# Altium footprint library 电阻封装库.PcbLib: 218 footprints (part 13 of 14)
Each footprint in its own frame and in the unit in brackets; x right, y up, seen from the top. Pads: shape width x height; smd on the part's side, far side on the other; paste and mask are expansions set on the pad; w line width, h text height; cw(c..) or ccw(c..) is an arc to the next point about the centre after c.
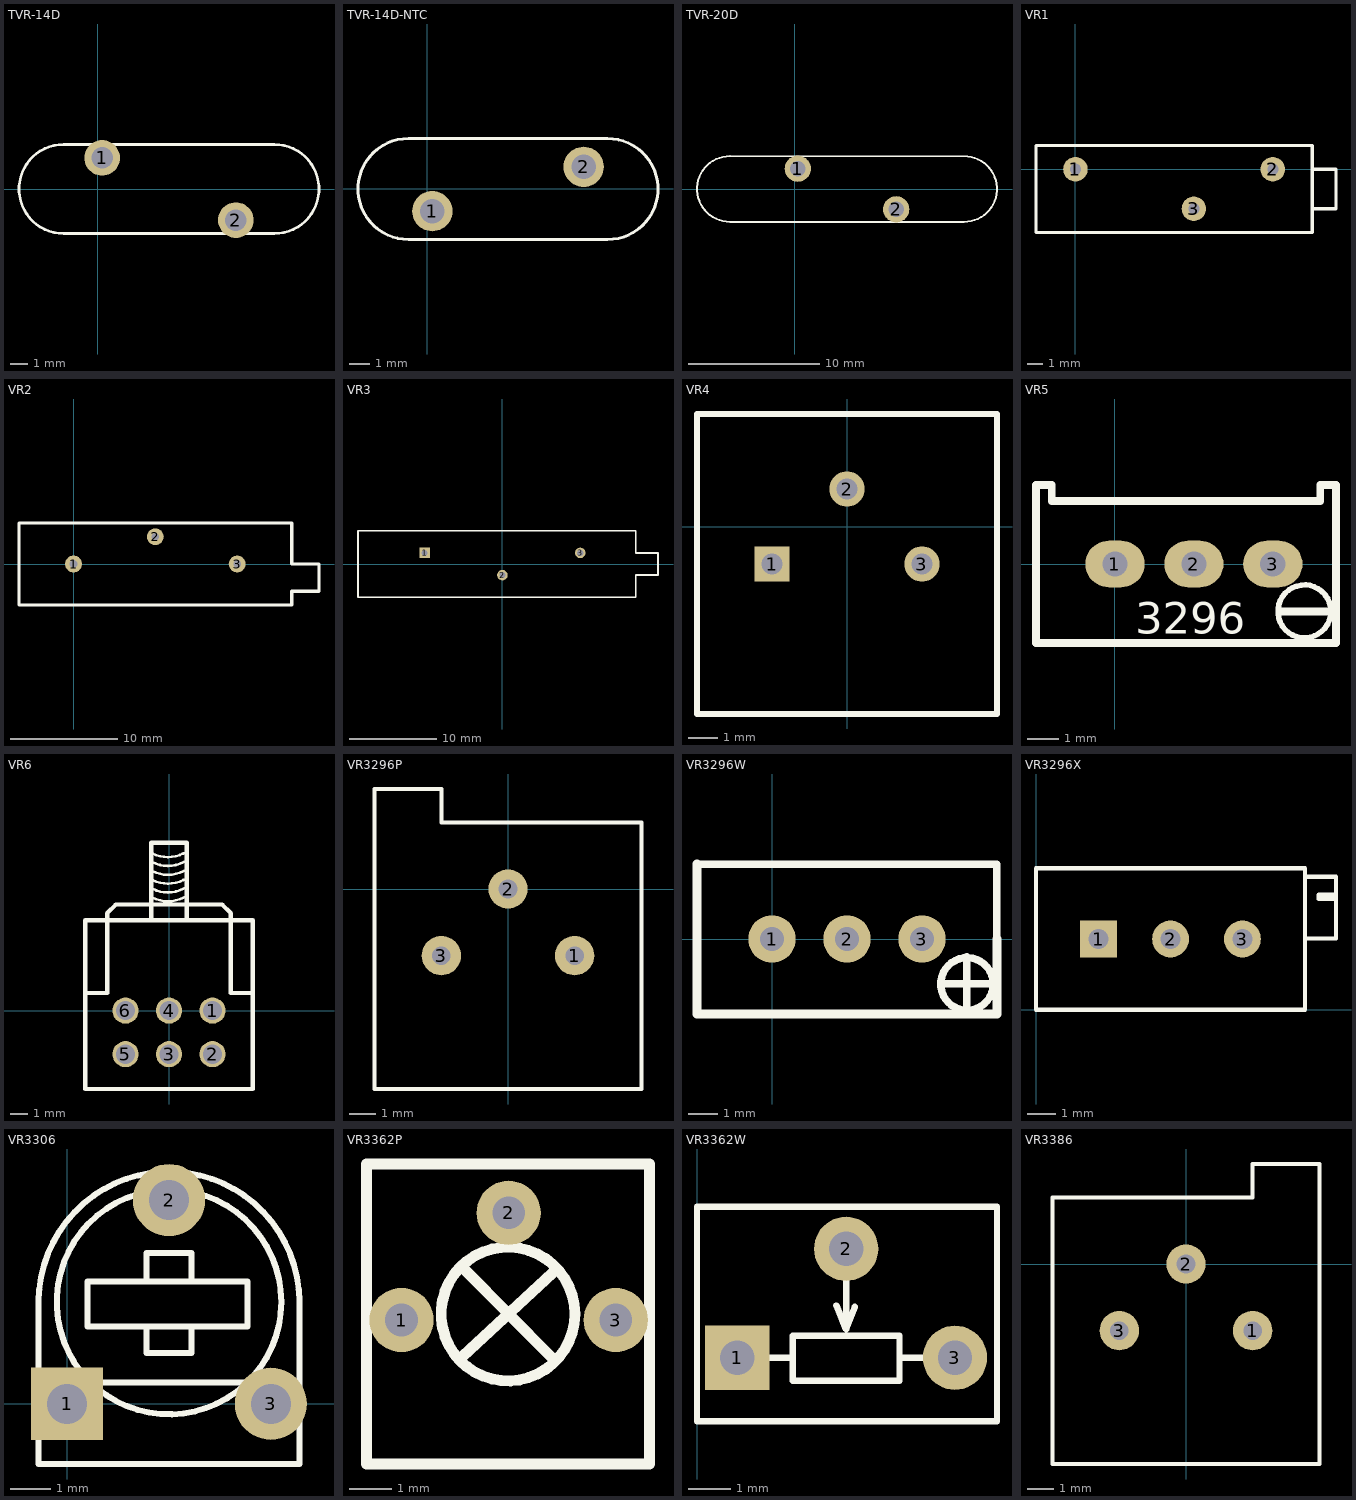
[diagram p12: the footprints below, top view; thin cyan lines are the x and y axes]

## TVR-14D [mm]
pads (2):
  round 2 hole 1.2: 1(0.25,1.75) 2(7.75,-1.75)
Top Overlay:
  lines w0.15: -1.921,-2.5 cw(c-1.921,0) -1.921,2.5 9.921,2.5 cw(c9.921,0) 9.921,-2.5 -1.921,-2.5
3D body "User Library-MOV 14mm.step": height 20.5, standoff -2, extent -4.496,-3.15 12.496,3.15

## TVR-14D-NTC [mm]
pads (2):
  round 2 hole 1.2: 1(0.25,-1.1) 2(7.75,1.1)
Top Overlay:
  lines w0.15: -0.929,-2.5 8.929,-2.5 ; -0.929,-2.498 cw(c-0.929,0.002) -0.929,2.502 ; -0.929,2.5 8.929,2.5 ; 8.929,-2.502 ccw(c8.929,-0.002) 8.929,2.498
3D body "User Library-SG200.step": height 15.5, standoff -8.5, extent -3.5,-2.505 11.5,2.505

## TVR-20D [mm]
pads (2):
  round 2 hole 1.2: 1(0.25,1.55) 2(7.75,-1.55)
Top Overlay:
  lines w0.15: -4.935,-2.5 12.935,-2.5 ; -4.935,-2.497 cw(c-4.935,0.003) -4.935,2.503 ; -4.935,2.501 12.935,2.497 cw(c12.935,-0.003) 12.935,-2.503
3D body "User Library-MOV 20mm.step": height 27.01, standoff -2, extent -7.506,-2.603 15.506,2.604

## VR1 [mil]
pads (3):
  round 62 hole 28: 1(0,0) 2(500,0) 3(300,-100)
Top Overlay:
  lines w8: 600,-100 660,-100 660,0 600,0 ; 600,-100 600,-160 -100,-160 -100,60 600,60 600,0 ; 600,-100 600,0

## VR2 [mil]
pads (3):
  round 62 hole 28: 1(0,0) 2(300,100) 3(600,0)
Top Overlay:
  lines w12: -200,-150 -200,150 800,150 800,0 900,0 900,-100 800,-100 800,-150 -200,-150

## VR3 [mm] "Tapped Resistor; 3 Leads"
pads (3):
  rect 1.2x1.2 hole 0.7: 1(-8.89,1.27)
  round 1.2 hole 0.7: 2(0,-1.27) 3(8.89,1.27)
Top Overlay:
  lines w0.2: -16.51,-3.81 -16.51,3.81 15.24,3.81 15.24,1.27 17.78,1.27 17.78,-1.27 15.24,-1.27 15.24,-3.81 -16.51,-3.81
3D body "vr3.STEP": height 10, standoff 0, extent -16.576,-3.556 16.424,3.544

## VR4 [mm] "Feed-Through Capacitor; 3 Leads"
pads (3):
  rect 1.2x1.2 hole 0.7: 1(-2.54,-1.27)
  round 1.2 hole 0.7: 2(0,1.27) 3(2.54,-1.27)
Top Overlay:
  lines w0.2: -5.08,-6.35 5.08,-6.35 5.08,3.81 2.54,3.81 -5.08,3.81 -5.08,-6.35
3D body "vr4.STEP": height 6, standoff 0, extent -5.022,-6.321 4.978,3.679

## VR5 [mm]
pads (3):
  oval 1.905x1.5 hole 0.813: 1(0,0) 2(2.54,0) 3(5.08,0)
Top Overlay:
  circle w0.178: c6.096,-1.524 r0.852
  lines w0.254: 5.334,-1.524 6.948,-1.524 ; -2.54,-2.54 7.112,-2.54 7.112,2.54 6.604,2.54 6.604,2.032 -2.032,2.032 -2.032,2.54 -2.54,2.54 -2.54,-2.54
  text "3296" at 0.65,-2.25 h1.02
3D body "User Library-67W.STEP": height 12.18, standoff -4.09, extent -2.309,-2.461 7.491,2.489

## VR6 [mm]
pads (6):
  round 1.5 hole 1.1: 1(2.5,0) 2(2.5,-2.5) 3(0,-2.5) 4(0,0) 5(-2.5,-2.5) 6(-2.5,0)
Top Overlay:
  lines w0.15: -0.938,6.486 ccw(c-0.063,8.236) 1.016,6.604 ; -0.938,6.994 ccw(c-0.063,8.744) 1.016,7.112 ; -0.938,7.502 ccw(c-0.063,9.252) 1.016,7.62 ; -0.938,8.01 ccw(c-0.063,9.76) 1.016,8.128 ; -0.938,8.518 ccw(c-0.063,10.268) 1.016,8.636 ; -0.938,9.026 ccw(c-0.063,10.776) 1.016,9.144
  lines w0.254: -4.8,1.016 -3.556,1.016 -3.556,5.2 -3.556,5.588 -3.048,6.096 3.048,6.096 3.556,5.588 3.556,5.2 3.556,1.016 4.8,1.016 ; -1.016,5.2 -1.016,9.652 1.016,9.652 1.016,5.2 ; -4.8,-4.5 -4.8,5.2 4.8,5.2 4.8,-4.5 -4.8,-4.5

## VR3296P [mm]
pads (3):
  round 1.5 hole 0.711: 1(2.54,-2.54) 2(0,0) 3(-2.54,-2.54)
Top Overlay:
  lines w0.15: -5.08,-7.62 5.08,-7.62 5.08,2.54 -2.54,2.54 -2.54,3.81 -5.08,3.81 -5.08,-7.62
3D body "3296P.step": height 4.4, standoff -8.69, extent -4.765,-7.776 4.765,3.774

## VR3296W [mm]
pads (3):
  round 1.6 hole 0.8: 1(0,0) 2(2.54,0) 3(5.08,0)
Top Overlay:
  circle w0.254: c6.604,-1.524 r0.89
  lines w0.254: -2.54,2.54 7.62,2.54 7.62,0 ; 5.8,-1.524 7.494,-1.524 ; 6.604,-2.54 6.604,-0.6
  lines w0.305: -2.54,2.54 -2.54,-2.54 7.62,-2.54 7.62,0

## VR3296X [mm]
pads (3):
  rect 1.3x1.3 hole 0.711: 1(2.21,2.5)
  round 1.3 hole 0.711: 2(4.75,2.5) 3(7.29,2.5)
Top Overlay:
  lines w0.15: 9.5,2.515 10.592,2.515 10.592,4.699 9.5,4.699 ; 10.592,3.2 10.592,3.912 9.982,3.912 9.982,4.064 10.592,4.064 ; 0,0 9.5,0 9.5,5 0,5 0,0
3D body "3296X.step": height 10.03, standoff -6.4, extent -0.013,0.084 11.037,4.915

## VR3306 [mm]
pads (3):
  rect 1.8x1.8 hole 1: 1(0,0)
  round 1.8 hole 1: 2(2.54,5.08) 3(5.08,0)
Top Overlay:
  circle w0.15: c2.54,2.54 r2.801
  lines w0.15: -0.711,-1.5 5.789,-1.5 5.789,2.539 ; -0.71,-1.499 -0.71,2.54 cw(c2.54,2.54) 5.79,2.54 ; 0.61,0.533 4.572,0.533 ; 1.981,1.93 1.981,1.27 3.099,1.27 3.099,1.93 ; 1.981,3.099 1.981,3.759 3.099,3.759 3.099,3.099 ; 0.508,1.93 0.508,3.048 4.496,3.048 4.496,1.93 0.508,1.93
3D body "User Library-Trimpot Vertical.step": height 4.2, standoff -1.45, extent 9.327,-1.755 19.327,13.545
3D body "User Library-Trimpot Horizontal.step": height 4.2, standoff -5.6, extent 9.103,14.919 19.103,25.119
3D body "User Library-Trimmer, 3306F-1.STEP": height 7.62, standoff -3.04, extent -0.865,-2.294 5.945,5.957

## VR3362P [mm]
pads (3):
  round 1.5 hole 0.762: 1(47.198,57.912) 2(49.698,60.412) 3(52.198,57.912)
Top Overlay:
  circle w0.254: c49.683,58.052 r1.56
  lines w0.254: 48.63,57.066 50.721,59.013 ; 48.702,59.056 50.678,57.066 ; 46.383,54.552 52.983,54.552 52.983,61.552 46.383,61.552 46.383,54.552

## VR3362W [mm]
pads (3):
  rect 1.5x1.5 hole 0.8: 1(0.94,3.48)
  round 1.5 hole 0.8: 2(3.48,6.02) 3(6.02,3.48)
Top Overlay:
  lines w0.15: 0.94,3.48 2.235,3.48 ; 3.251,4.699 3.48,4.14 ; 3.48,5.842 3.48,4.14 ; 3.683,4.674 3.48,4.14 ; 4.724,3.48 6.02,3.48 ; 2.235,3.48 2.235,2.946 4.724,2.946 4.724,3.988 2.235,3.988 2.235,3.48 ; 0,2 0,7 7,7 7,2 0,2
3D body "User Library-3362W.step": height 6.99, standoff -1.5, extent 0.2,2.365 6.8,7.075

## VR3386 [mm]
pads (3):
  round 1.5 hole 0.711: 1(2.54,-2.54) 2(0,0) 3(-2.54,-2.54)
Top Overlay:
  lines w0.15: -5.08,-7.62 5.08,-7.62 5.08,3.81 2.54,3.81 2.54,2.54 -5.08,2.54 -5.08,-7.62
3D body "SW3dPS-3386P-S.STEP": height 5.02, standoff -1.99, extent -4.8,-7.34 4.8,2.26